# Altium footprint library Connectors.PcbLib: 131 footprints (part 6 of 9)
Each footprint in its own frame and in the unit in brackets; x right, y up, seen from the top. Pads: shape width x height; smd on the part's side, far side on the other; paste and mask are expansions set on the pad; w line width, h text height; cw(c..) or ccw(c..) is an arc to the next point about the centre after c.
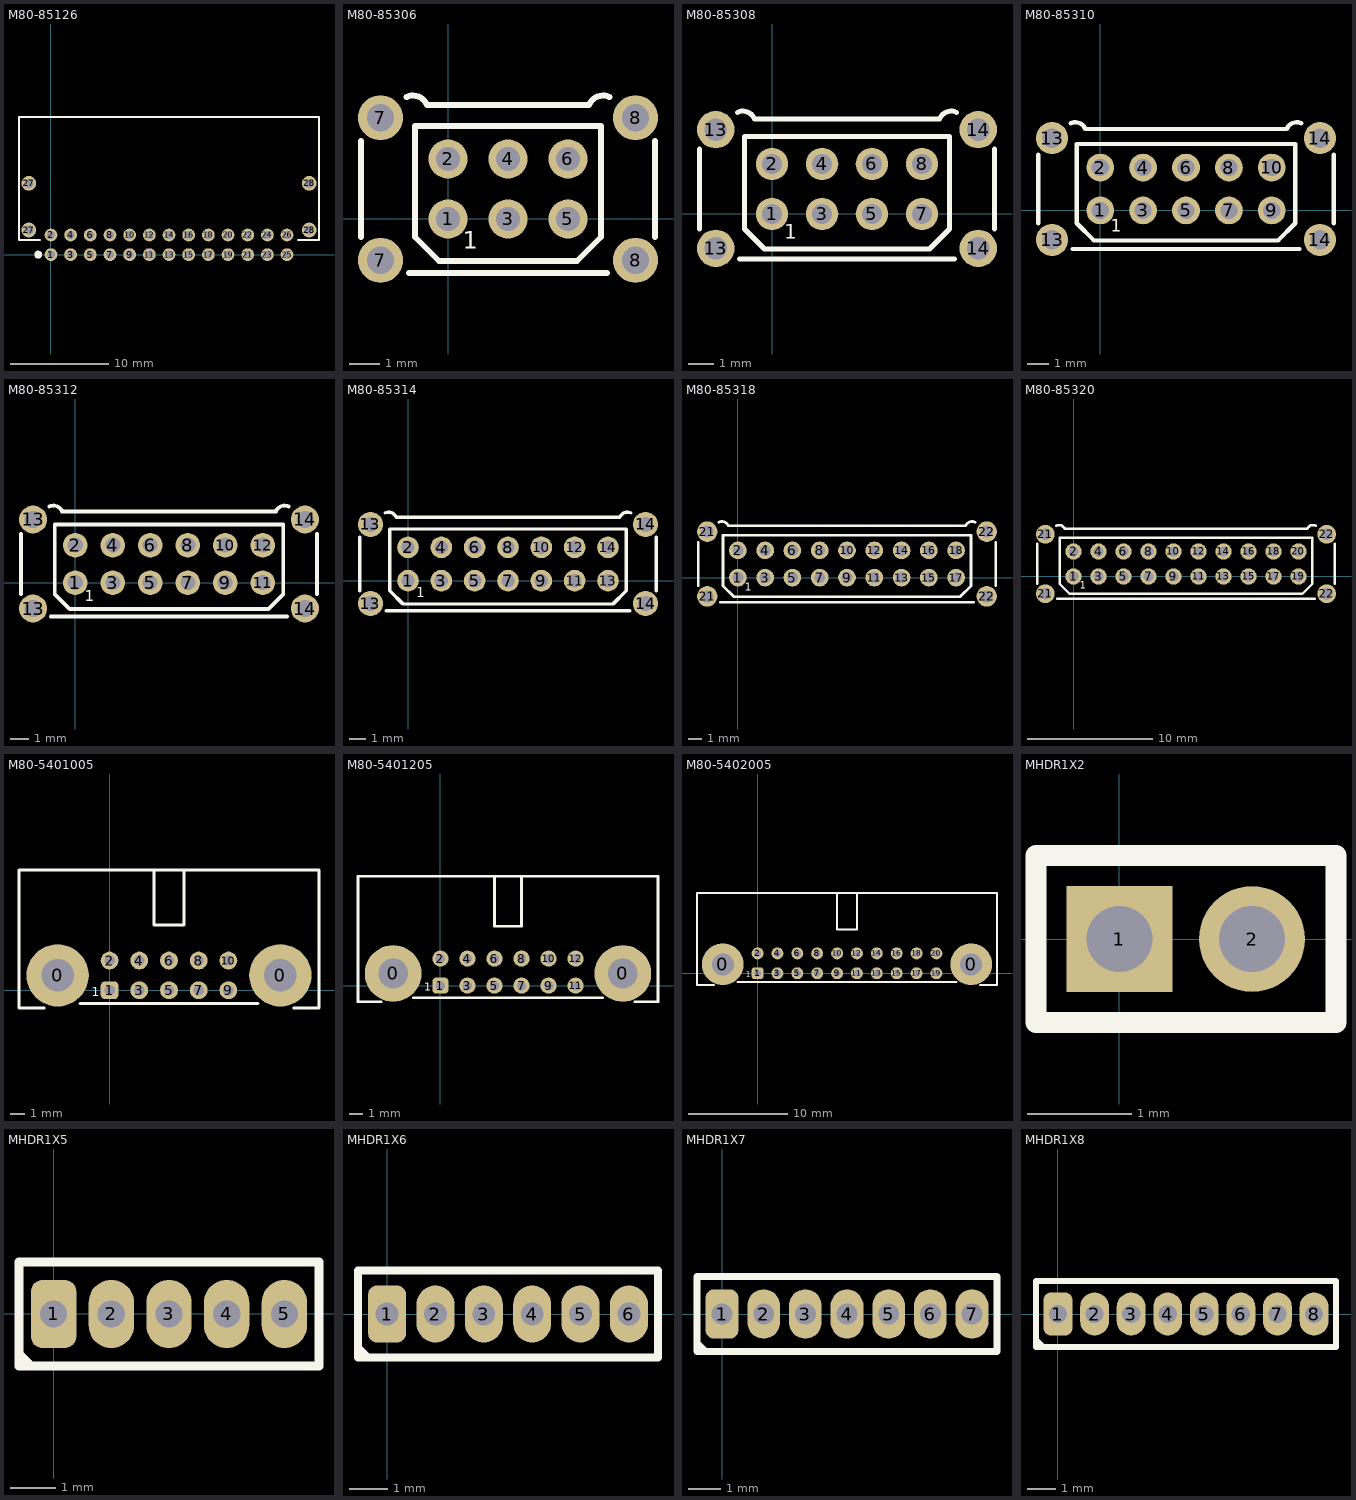
[diagram p5: the footprints below, top view; thin cyan lines are the x and y axes]

## M80-85126 [mm]
pads (30):
  round 1.3 hole 0.8: 1(0,0) 2(0,2) 3(2,0) 4(2,2) 5(4,0) 6(4,2) 7(6,0) 8(6,2) 9(8,0) 10(8,2) 11(10,0) 12(10,2) 13(12,0) 14(12,2) 15(14,0) 16(14,2) 17(16,0) 18(16,2) 19(18,0) 20(18,2) 21(20,0) 22(20,2) 23(22,0) 24(22,2) 25(24,0) 26(24,2)
  round 1.5 hole 0.9: 27(-2.25,2.5) 27(-2.25,7.25) 28(26.25,2.5) 28(26.25,7.25)
Top Overlay:
  circle w0.4: c-1.3,0 r0.2
  lines w0.2: -1.1,1.5 -3.25,1.5 -3.25,14 27.25,14 27.25,1.5 25.1,1.5
Top Assembly:
  text ".Designator" at 7.002,4.667 h1
3D body "m80-8512642_asm.stp": height 5.87, standoff -3.17, extent -2.95,-0.25 26.95,10.85

## M80-85306 [mm]
pads (10):
  round 1.3 hole 0.8: 1(0,0) 2(0,2) 3(2,0) 4(2,2) 5(4,0) 6(4,2)
  round 1.5 hole 0.9: 7(-2.25,-1.375) 7(-2.25,3.375) 8(6.25,-1.375) 8(6.25,3.375)
Top Overlay:
  lines w0.2: -2.9,-0.6 -2.9,2.6 ; -1.383,4.064 cw(c-1.164,3.614) -0.7,3.8 4.7,3.8 cw(c5.164,3.614) 5.383,4.064 ; -1.3,-1.8 5.3,-1.8 ; 6.9,-0.6 6.9,2.6 ; -1.1,-0.6 -1.1,3.1 5.1,3.1 5.1,-0.6 4.3,-1.4 -0.3,-1.4 -1.1,-0.6
  text "1" at 0.5,-1.2 h1
Top Assembly:
  text ".Designator" at -2.998,0.667 h1
3D body "m80-8530642_asm.stp": height 8.25, standoff -3.45, extent -2.95,-1.8 6.95,4.05

## M80-85308 [mm]
height 6
pads (12):
  round 1.3 hole 0.8: 1(0,0) 2(0,2) 3(2,0) 4(2,2) 5(4,0) 6(4,2) 7(6,0) 8(6,2)
  round 1.5 hole 0.9: 13(-2.25,-1.375) 13(-2.25,3.375) 14(8.25,-1.375) 14(8.25,3.375)
Top Overlay:
  lines w0.2: -2.9,-0.6 -2.9,2.6 ; -1.383,4.064 cw(c-1.164,3.614) -0.7,3.8 6.7,3.8 cw(c7.164,3.614) 7.383,4.064 ; -1.3,-1.8 7.3,-1.8 ; 8.9,-0.6 8.9,2.6 ; -1.1,-0.6 -1.1,3.1 7.1,3.1 7.1,-0.6 6.3,-1.4 -0.3,-1.4 -1.1,-0.6
  text "1" at 0.5,-1.2 h1
Top Assembly:
  text ".Designator" at -1.998,0.667 h1
3D body "m80-8530842_asm.stp": height 8.25, standoff -3.45, extent -2.975,-1.75 8.925,4.1

## M80-85310 [mm]
height 6
pads (14):
  round 1.3 hole 0.8: 1(0,0) 2(0,2) 3(2,0) 4(2,2) 5(4,0) 6(4,2) 7(6,0) 8(6,2) 9(8,0) 10(8,2)
  round 1.5 hole 0.9: 13(-2.25,-1.375) 13(-2.25,3.375) 14(10.25,-1.375) 14(10.25,3.375)
Top Overlay:
  lines w0.2: -2.9,-0.6 -2.9,2.6 ; -1.383,4.064 cw(c-1.164,3.614) -0.7,3.8 8.7,3.8 cw(c9.164,3.614) 9.383,4.064 ; -1.3,-1.8 9.3,-1.8 ; 10.9,-0.6 10.9,2.6 ; -1.1,-0.6 -0.3,-1.4 8.3,-1.4 9.1,-0.6 9.1,3.1 -1.1,3.1 -1.1,-0.6
  text "1" at 0.5,-1.2 h1
Top Assembly:
  text ".Designator" at -0.998,0.667 h1
3D body "m80-8531042_asm.stp": height 8.25, standoff -3.45, extent -2.95,-1.775 10.95,4.075

## M80-85312 [mm]
pads (16):
  round 1.3 hole 0.8: 1(0,0) 2(0,2) 3(2,0) 4(2,2) 5(4,0) 6(4,2) 7(6,0) 8(6,2) 9(8,0) 10(8,2) 11(10,0) 12(10,2)
  round 1.5 hole 0.9: 13(-2.25,-1.375) 13(-2.25,3.375) 14(12.25,-1.375) 14(12.25,3.375)
Top Overlay:
  lines w0.2: -2.9,-0.6 -2.9,2.6 ; -1.383,4.064 cw(c-1.164,3.614) -0.7,3.8 10.7,3.8 cw(c11.164,3.614) 11.383,4.064 ; -1.3,-1.8 11.3,-1.8 ; 12.9,-0.6 12.9,2.6 ; -1.1,-0.6 -1.1,3.1 11.1,3.1 11.1,-0.6 10.3,-1.4 -0.3,-1.4 -1.1,-0.6
  text "1" at 0.5,-1.2 h1
Top Assembly:
  text ".Designator" at 0.002,0.667 h1
3D body "m80-8531242_asm.stp": height 8.25, standoff -3.45, extent -2.95,-1.75 12.95,4.1

## M80-85314 [mm]
pads (18):
  round 1.3 hole 0.8: 1(0,0) 2(0,2) 3(2,0) 4(2,2) 5(4,0) 6(4,2) 7(6,0) 8(6,2) 9(8,0) 10(8,2) 11(10,0) 12(10,2) 13(12,0) 14(12,2)
  round 1.5 hole 0.9: 13(-2.25,-1.375) 13(-2.25,3.375) 14(14.25,-1.375) 14(14.25,3.375)
Top Overlay:
  lines w0.2: -2.9,-0.6 -2.9,2.6 ; -1.383,4.064 cw(c-1.164,3.614) -0.7,3.8 12.7,3.8 cw(c13.164,3.614) 13.383,4.064 ; -1.3,-1.8 13.3,-1.8 ; 14.9,-0.6 14.9,2.6 ; -1.1,-0.6 -0.3,-1.4 12.3,-1.4 13.1,-0.6 13.1,3.1 -1.1,3.1 -1.1,-0.6
  text "1" at 0.5,-1.2 h1
Top Assembly:
  text ".Designator" at 1.002,0.667 h1
3D body "m80-8531442_asm.stp": height 8.05, standoff -3.65, extent -2.95,-1.775 14.95,4.075

## M80-85318 [mm]
pads (22):
  round 1.3 hole 0.8: 1(0,0) 2(0,2) 3(2,0) 4(2,2) 5(4,0) 6(4,2) 7(6,0) 8(6,2) 9(8,0) 10(8,2) 11(10,0) 12(10,2) 13(12,0) 14(12,2) 15(14,0) 16(14,2) 17(16,0) 18(16,2)
  round 1.5 hole 0.9: 21(-2.25,-1.375) 21(-2.25,3.375) 22(18.25,-1.375) 22(18.25,3.375)
Top Overlay:
  lines w0.2: -2.9,-0.6 -2.9,2.6 ; -1.383,4.064 cw(c-1.164,3.614) -0.7,3.8 16.7,3.8 cw(c17.164,3.614) 17.383,4.064 ; -1.3,-1.8 17.3,-1.8 ; 18.9,-0.6 18.9,2.6 ; -1.1,-0.6 -1.1,3.1 17.1,3.1 17.1,-0.6 16.3,-1.4 -0.3,-1.4 -1.1,-0.6
  text "1" at 0.5,-1.2 h1
Top Assembly:
  text ".Designator" at 3.002,0.667 h1
3D body "m80-8531842_asm.stp": height 8.25, standoff -3.45, extent -2.95,-1.775 18.95,4.075

## M80-85320 [mm]
pads (24):
  round 1.3 hole 0.8: 1(0,0) 2(0,2) 3(2,0) 4(2,2) 5(4,0) 6(4,2) 7(6,0) 8(6,2) 9(8,0) 10(8,2) 11(10,0) 12(10,2) 13(12,0) 14(12,2) 15(14,0) 16(14,2) 17(16,0) 18(16,2) 19(18,0) 20(18,2)
  round 1.5 hole 0.9: 21(-2.25,-1.375) 21(-2.25,3.375) 22(20.25,-1.375) 22(20.25,3.375)
Top Overlay:
  lines w0.2: -2.9,-0.6 -2.9,2.6 ; -1.383,4.064 cw(c-1.164,3.614) -0.7,3.8 18.7,3.8 cw(c19.164,3.614) 19.383,4.064 ; -1.3,-1.8 19.3,-1.8 ; 20.9,-0.6 20.9,2.6 ; -1.1,-0.6 -0.3,-1.4 18.3,-1.4 19.1,-0.6 19.1,3.1 -1.1,3.1 -1.1,-0.6
  text "1" at 0.5,-1.2 h1
Top Assembly:
  text ".Designator" at 4.002,0.667 h1
3D body "m80-8532042_asm.stp": height 8.25, standoff -3.45, extent -2.95,-2.075 20.95,3.775

## M80-5401005 [mm]
height 6
pads (12):
  round 4.2 hole 2.2: 0(-3.5,1) 0(11.5,1)
  rrect50% 1.2x1.2 hole 0.7: 1(0,0)
  round 1.2 hole 0.7: 2(0,2) 3(2,0) 4(2,2) 5(4,0) 6(4,2) 7(6,0) 8(6,2) 9(8,0) 10(8,2)
Top Overlay:
  lines w0.2: -4.4,-1.2 -6.1,-1.2 -6.1,8.1 14.1,8.1 14.1,-1.2 12.4,-1.2 ; -2,-0.9 10,-0.9 ; 3,8.1 3,4.4 5,4.4 5,8.1
  text "1" at -1.2,-0.6 h1
Top Assembly:
  text ".Designator" at -0.998,0.667 h1
3D body "m80-5401005_asm.stp": height 6.08, standoff -3.05, extent -6,-1.1 14,8

## M80-5401205 [mm]
height 6
pads (14):
  round 4.2 hole 2.2: 0(-3.5,0.9) 0(13.5,0.9)
  rrect50% 1.2x1.2 hole 0.7: 1(0,0)
  round 1.2 hole 0.7: 2(0,2) 3(2,0) 4(2,2) 5(4,0) 6(4,2) 7(6,0) 8(6,2) 9(8,0) 10(8,2) 11(10,0) 12(10,2)
Top Overlay:
  lines w0.2: -4.4,-1.2 -6.1,-1.2 -6.1,8.1 16.1,8.1 16.1,-1.2 14.4,-1.2 ; -2,-0.9 12,-0.9 ; 4,8.1 4,4.4 6,4.4 6,8.1
  text "1" at -1.2,-0.6 h1
Top Assembly:
  text ".Designator" at 0.002,0.667 h1
3D body "m80-5401205.STEP": height 6.08, standoff -3.05, extent -6,-1.1 16,8

## M80-5402005 [mm]
height 6
pads (22):
  round 4.2 hole 2.2: 0(-3.5,0.9) 0(21.5,0.9)
  rrect50% 1.2x1.2 hole 0.7: 1(0,0)
  round 1.2 hole 0.7: 2(0,2) 3(2,0) 4(2,2) 5(4,0) 6(4,2) 7(6,0) 8(6,2) 9(8,0) 10(8,2) 11(10,0) 12(10,2) 13(12,0) 14(12,2) 15(14,0) 16(14,2) 17(16,0) 18(16,2) 19(18,0) 20(18,2)
Top Overlay:
  lines w0.2: -4.4,-1.2 -6.1,-1.2 -6.1,8.1 24.1,8.1 24.1,-1.2 22.4,-1.2 ; -2,-0.9 20,-0.9 ; 8,8.1 8,4.4 10,4.4 10,8.1
  text "1" at -1.2,-0.6 h1
Top Assembly:
  text ".Designator" at 4.002,0.667 h1
3D body "m80-5402005_asm.stp": height 6.08, standoff -3.05, extent -6,-1.1 24,8

## MHDR1X2 [mil]
pads (2):
  rect 40x40 hole 25: 1(0,0)
  round 40 hole 25: 2(50,0)
Top Overlay:
  lines w8: -31.5,-31.5 81.69,-31.5 81.69,31.5 -31.5,31.5 -31.5,-31.5
Top Assembly:
  text ".Designator" at -171.2,-13.12 h39.37

## MHDR1X5 [mm]
pads (5):
  rrect50% 1x1.5 hole 0.6: 1(0,0)
  oval 1x1.5 hole 0.6: 2(1.27,0) 3(2.54,0) 4(3.81,0) 5(5.08,0)
Top Overlay:
  lines w0.203: -0.72,-0.931 -0.508,-1.143 ; -0.762,-1.143 5.842,-1.143 5.842,1.143 -0.762,1.143 -0.762,-1.143
Top Assembly:
  text ".Designator" at -2.458,-0.333 h1
3D body "Samtec-FTS-105-01-F-S.step": height 3.91, standoff -2.29, extent -0.625,-1.075 5.725,1.084

## MHDR1X6 [mm]
pads (6):
  rrect50% 1x1.5 hole 0.6: 1(0,0)
  oval 1x1.5 hole 0.6: 2(1.27,0) 3(2.54,0) 4(3.81,0) 5(5.08,0) 6(6.35,0)
Top Overlay:
  lines w0.203: -0.72,-0.931 -0.508,-1.143 ; -0.762,-1.143 -0.762,1.143 7.112,1.143 7.112,-1.143 -0.762,-1.143
Top Assembly:
  text ".Designator" at -1.823,-0.333 h1
3D body "Samtec-FTS-106-01-F-S.STEP": height 3.91, standoff -2.29, extent -0.66,-1.075 6.96,1.084

## MHDR1X7 [mm]
pads (7):
  rrect50% 1x1.5 hole 0.635: 1(0,0)
  oval 1x1.5 hole 0.635: 2(1.27,0) 3(2.54,0) 4(3.81,0) 5(5.08,0) 6(6.35,0) 7(7.62,0)
Top Overlay:
  lines w0.203: -0.762,-0.889 -0.55,-1.101 ; -0.762,-1.143 8.382,-1.143 8.382,1.143 -0.762,1.143 -0.762,-1.143
Top Assembly:
  text ".Designator" at -1.188,-0.333 h1
3D body "Samtec-FTS-107-01-F-S.step": height 3.91, standoff -2.29, extent -0.625,-1.075 8.265,1.084

## MHDR1X8 [mm]
pads (8):
  rrect50% 1x1.5 hole 0.635: 1(0,0)
  oval 1x1.5 hole 0.635: 2(1.27,0) 3(2.54,0) 4(3.81,0) 5(5.08,0) 6(6.35,0) 7(7.62,0) 8(8.89,0)
Top Overlay:
  lines w0.203: -0.762,-0.889 -0.55,-1.101 ; -0.762,-1.143 -0.762,1.143 9.652,1.143 9.652,-1.143 -0.762,-1.143
Top Assembly:
  text ".Designator" at 0.717,-0.333 h1
3D body "Samtec-FTS-108-01-L-S.step": height 3.91, standoff -2.29, extent -0.63,-1.079 9.53,1.079